# Altium footprint library Integrated_Circuit.PcbLib: 85 footprints (part 3 of 6)
Each footprint in its own frame and in the unit in brackets; x right, y up, seen from the top. Pads: shape width x height; smd on the part's side, far side on the other; paste and mask are expansions set on the pad; w line width, h text height; cw(c..) or ccw(c..) is an arc to the next point about the centre after c.
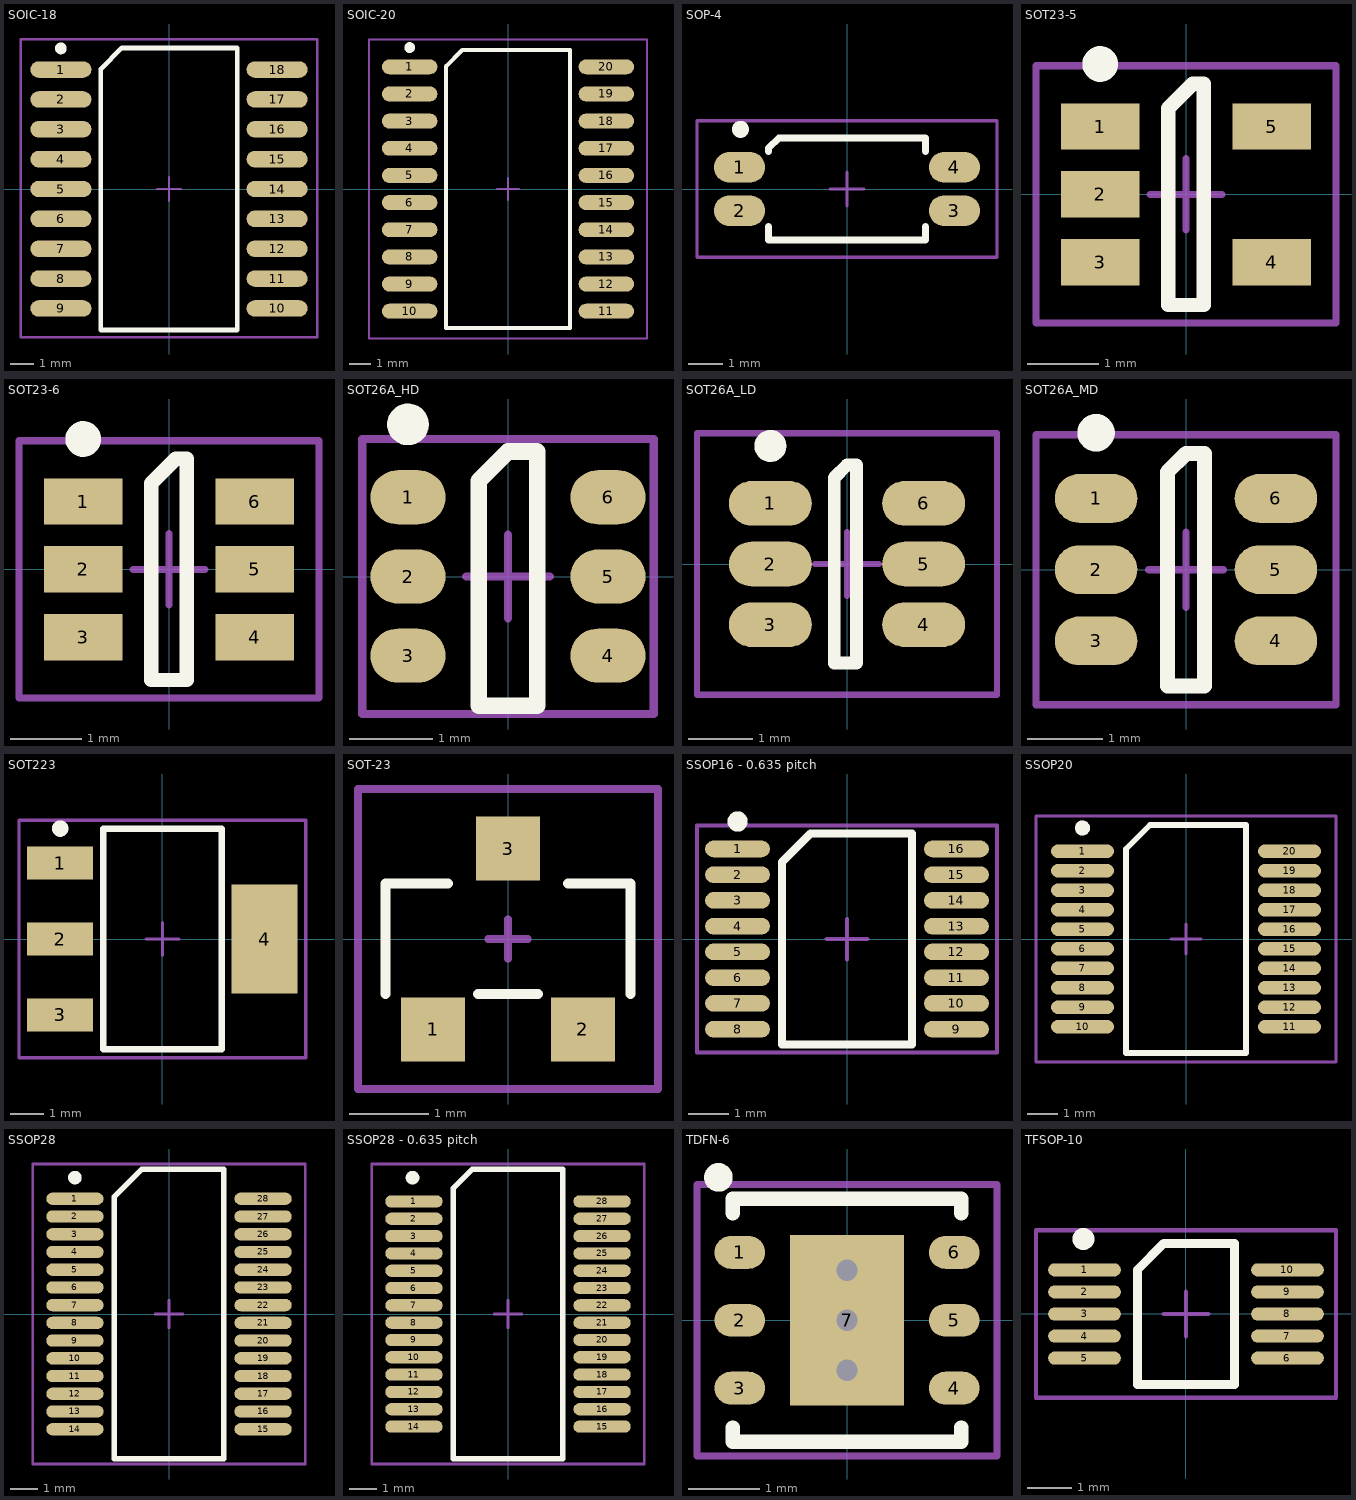
[diagram p2: the footprints below, top view; thin cyan lines are the x and y axes]

## SOIC-18 [mm]
pads (18):
  oval 2.6x0.7 smd: 1(-4.6,5.08) 2(-4.6,3.81) 3(-4.6,2.54) 4(-4.6,1.27) 5(-4.6,0) 6(-4.6,-1.27) 7(-4.6,-2.54) 8(-4.6,-3.81) 9(-4.6,-5.08) 10(4.6,-5.08) 11(4.6,-3.81) 12(4.6,-2.54) 13(4.6,-1.27) 14(4.6,0) 15(4.6,1.27) 16(4.6,2.54) 17(4.6,3.81) 18(4.6,5.08)
Top Overlay:
  circle w0.25: c-4.6,5.98 r0.125
  lines w0.2: -2.9,-6 -2.9,5.101 -2.001,6 2.9,6 2.9,-6 -2.9,-6
Mechanical 15:
  lines w0.1: -0.5,0 0.5,0 ; 0,-0.5 0,0.5 ; -6.3,-6.3 -6.3,6.365 6.3,6.365 6.3,-6.3 -6.3,-6.3
3D body "User Library-SOIC-18-300.STEP": height 2.57, standoff -0.03, extent -5.3,-5.875 5.3,5.875

## SOIC-20 [mm]
pads (20):
  oval 2.6x0.7 smd: 1(-4.6,5.715) 2(-4.6,4.445) 3(-4.6,3.175) 4(-4.6,1.905) 5(-4.6,0.635) 6(-4.6,-0.635) 7(-4.6,-1.905) 8(-4.6,-3.175) 9(-4.6,-4.445) 10(-4.6,-5.715) 11(4.6,-5.715) 12(4.6,-4.445) 13(4.6,-3.175) 14(4.6,-1.905) 15(4.6,-0.635) 16(4.6,0.635) 17(4.6,1.905) 18(4.6,3.175) 19(4.6,4.445) 20(4.6,5.715)
Top Overlay:
  circle w0.25: c-4.6,6.615 r0.125
  lines w0.2: -2.9,-6.5 -2.9,5.736 -2.136,6.5 2.9,6.5 2.9,-6.5 -2.9,-6.5
Mechanical 15:
  lines w0.1: -0.5,0 0.5,0 ; 0,-0.5 0,0.5 ; -6.5,-7 -6.5,7 6.5,7 6.5,-7 -6.5,-7
3D body "SOIC-20.STEP": height 2.57, standoff -0.03, extent -5.3,-6.5 5.3,6.5

## SOP-4 [mm] "SOP, 4 Pin, 1.27mm Pitch"
pads (4):
  oval 1.5x0.9 smd: 1(-3.15,0.635) 2(-3.15,-0.635) 3(3.15,-0.635) 4(3.15,0.635)
Top Overlay:
  circle w0.25: c-3.125,1.75 r0.125
  lines w0.2: -2.3,-1.1 -2.3,-1.5 2.3,-1.5 2.3,-1.1 ; -2.3,1.1 -2.3,1.2 -2,1.5 2.3,1.5 2.3,1.1
Mechanical 15:
  lines w0.1: -0.5,0 0.5,0 ; 0,-0.5 0,0.5 ; -4.4,-2 4.4,-2 4.4,2 -4.4,2 -4.4,-2
3D body "SOP-4.STEP": height 2.1, standoff 0, extent -3.5,-1.4 3.5,1.4

## SOT23-5 [mm]
height 1.45
pads (5):
  rect 1.1x0.65 smd: 1(-1.2,0.95) 2(-1.2,0) 3(-1.2,-0.95) 4(1.2,-0.95) 5(1.2,0.95)
Top Overlay:
  circle w0.25: c-1.2,1.825 r0.125
  lines w0.2: -0.25,-1.55 0.25,-1.55 0.25,1.55 0.094,1.55 -0.25,1.206 -0.25,-1.55
Mechanical 15:
  lines w0.1: -0.5,0 0.5,0 ; 0,-0.5 0,0.5 ; -2.1,-1.8 -2.1,1.8 2.1,1.8 2.1,-1.8 -2.1,-1.8
3D body "SOT23-5.STEP": height 1.3, standoff 0, extent -1.5,-1.5 1.5,1.5

## SOT23-6 [mm]
height 1.45
pads (6):
  rect 1.1x0.65 smd: 1(-1.2,0.95) 2(-1.2,0) 3(-1.2,-0.95) 4(1.2,-0.95) 5(1.2,0) 6(1.2,0.95)
Top Overlay:
  circle w0.25: c-1.2,1.825 r0.125
  lines w0.2: -0.25,-1.55 -0.25,1.206 0.094,1.55 0.25,1.55 0.25,-1.55 -0.25,-1.55
Mechanical 15:
  lines w0.1: -0.5,0 0.5,0 ; 0,-0.5 0,0.5 ; -2.1,-1.8 2.1,-1.8 2.1,1.8 -2.1,1.8 -2.1,-1.8
3D body "User Library-SOT23-6-2.STEP": height 1.45, standoff 0, extent -1.4,-1.45 1.4,1.45

## SOT26A_HD [mm] "SOT23, 6-Leads, Body 2.9x1.7mm, Pitch 0.95mm, Lead Span 2.8mm, IPC High Density"
height 1.45
pads (6):
  oval 0.9x0.65 smd: 1(-1.2,0.95) 2(-1.2,0) 3(-1.2,-0.95) 4(1.2,-0.95) 5(1.2,0) 6(1.2,0.95)
Top Overlay:
  circle w0.25: c-1.2,1.825 r0.125
  lines w0.2: -0.35,1 -0.35,1.15 ; -0.35,1.15 -0.35,-1.55 0.35,-1.55 0.35,1.5 0,1.5 -0.35,1.15
Mechanical 15:
  lines w0.1: -0.5,0 0.5,0 ; 0,-0.5 0,0.5 ; -1.75,-1.65 -1.75,1.65 1.75,1.65 1.75,-1.65 -1.75,-1.65
3D body "User Library-SOT23-6-1.step": height 1.09, standoff 0, extent -1.207,-1.41 1.219,1.384

## SOT26A_LD [mm]
pads (6):
  oval 1.3x0.7 smd: 1(-1.2,0.95) 2(-1.2,0) 3(-1.2,-0.95) 4(1.2,-0.95) 5(1.2,0) 6(1.2,0.95)
Top Overlay:
  circle w0.25: c-1.2,1.85 r0.125
  lines w0.2: -0.2,1.3 -0.2,1.35 ; -0.2,1.35 0,1.55 0.15,1.55 0.15,-1.55 -0.2,-1.55 -0.2,1.35
Mechanical 15:
  lines w0.1: -0.5,0 0.5,0 ; 0,-0.5 0,0.5 ; -2.35,-2.05 -2.35,2.05 2.35,2.05 2.35,-2.05 -2.35,-2.05
3D body "User Library-SOT23-6-1.step": height 1.09, standoff 0, extent -1.232,-1.384 1.194,1.41

## SOT26A_MD [mm] "SOT23, 6-Leads, Body 2.9x1.7mm, Pitch 0.95mm, Lead Span 2.8mm, IPC Medium Density"
height 1.45
pads (6):
  oval 1.1x0.65 smd: 1(-1.2,0.95) 2(-1.2,0) 3(-1.2,-0.95) 4(1.2,-0.95) 5(1.2,0) 6(1.2,0.95)
Top Overlay:
  circle w0.25: c-1.2,1.825 r0.125
  lines w0.2: -0.25,1.2 -0.25,1.3 ; -0.25,1.3 -0.25,-1.55 0.25,-1.55 0.25,1.55 0,1.55 -0.25,1.3
Mechanical 15:
  lines w0.1: -0.5,0 0.5,0 ; 0,-0.5 0,0.5 ; -2,-1.8 2,-1.8 2,1.8 -2,1.8 -2,-1.8
3D body "User Library-SOT23-6-1.step": height 1.09, standoff 0, extent -1.213,-1.397 1.213,1.397

## SOT223 [mm] "SOT223, 4-Leads, Body 6.5x3.5mm, Pitch 2.3mm, Lead Span 7mm, IPC Medium Density"
height 1.8
pads (4):
  rect 2x1 smd: 1(-3.1,2.3) 2(-3.1,0) 3(-3.1,-2.3)
  rect 2x3.3 smd: 4(3.1,0)
Top Overlay:
  circle w0.25: c-3.1,3.35 r0.125
  lines w0.2: -1.8,-3.35 1.8,-3.35 1.8,3.35 -1.8,3.35 -1.8,-3.35
Mechanical 13:
  lines w0.1: -1.85,-3.35 1.85,-3.35 1.85,3.35 -1.85,3.35 -1.85,-3.35
Mechanical 15:
  lines w0.1: -0.5,0 0.5,0 ; 0,-0.5 0,0.5 ; -4.35,-3.6 4.35,-3.6 4.35,3.6 -4.35,3.6 -4.35,-3.6
3D body "SOT-223.STEP": height 1.85, standoff -0.05, extent -3.674,-3.398 3.53,3.302

## SOT-23 [mil]
pads (3):
  rect 32x32 smd: 1(-37.4,-45.1) 2(37.4,-45.1) 3(0,45.1)
Top Overlay:
  lines w5: -61,-27.5 -61,27.6 -30,27.6 ; -15,-27.5 15,-27.5 ; 30,27.6 61,27.6 61,-27.5
Mechanical 15:
  lines w3.94: -9.84,0 9.84,0 ; 0,-9.84 0,9.84 ; -74.8,-74.8 -74.8,74.8 74.8,74.8 74.8,-74.8 -74.8,-74.8
3D body "SW3DPS-SOT-23-DEFAULT.step": height 42.91, standoff -0.39, extent -59.06,-49.21 59.06,49.21

## SSOP16 - 0.635 pitch [mm]
pads (16):
  oval 1.6x0.41 smd: 1(-2.7,2.222) 2(-2.7,1.587) 3(-2.7,0.953) 4(-2.7,0.318) 5(-2.7,-0.318) 6(-2.7,-0.953) 7(-2.7,-1.587) 8(-2.7,-2.222) 9(2.7,-2.222) 10(2.7,-1.587) 11(2.7,-0.953) 12(2.7,-0.318) 13(2.7,0.318) 14(2.7,0.953) 15(2.7,1.587) 16(2.7,2.222)
Top Overlay:
  circle w0.25: c-2.7,2.9 r0.125
  lines w0.2: -1.6,-2.6 1.6,-2.6 1.6,2.6 -0.9,2.6 -1.6,1.9 -1.6,-2.6
Mechanical 15:
  lines w0.1: -0.5,0 0.5,0 ; 0,-0.5 0,0.5 ; -3.7,-2.8 -3.7,2.8 3.7,2.8 3.7,-2.8 -3.7,-2.8
3D body "User Library-SSOP16.step": height 1.1, standoff 0, extent -2.997,-2.525 2.997,2.453

## SSOP20 [mm]
pads (20):
  oval 2.1x0.45 smd: 1(-3.45,2.925) 2(-3.45,2.275) 3(-3.45,1.625) 4(-3.45,0.975) 5(-3.45,0.325) 6(-3.45,-0.325) 7(-3.45,-0.975) 8(-3.45,-1.625) 9(-3.45,-2.275) 10(-3.45,-2.925) 11(3.45,-2.925) 12(3.45,-2.275) 13(3.45,-1.625) 14(3.45,-0.975) 15(3.45,-0.325) 16(3.45,0.325) 17(3.45,0.975) 18(3.45,1.625) 19(3.45,2.275) 20(3.45,2.925)
Top Overlay:
  circle w0.25: c-3.45,3.7 r0.125
  lines w0.2: -2,-3.8 2,-3.8 2,3.8 -1.2,3.8 -2,3 -2,-3.8
Mechanical 15:
  lines w0.1: -0.5,0 0.5,0 ; 0,-0.5 0,0.5 ; -5,-4.1 -5,4.1 5,4.1 5,-4.1 -5,-4.1
3D body "User Library-SSOP 20 PIN-1.STEP": height 1.98, standoff -0.01, extent -3.95,-3.665 3.95,3.665

## SSOP28 [mm]
pads (28):
  oval 2.1x0.45 smd: 1(-3.45,4.225) 2(-3.45,3.575) 3(-3.45,2.925) 4(-3.45,2.275) 5(-3.45,1.625) 6(-3.45,0.975) 7(-3.45,0.325) 8(-3.45,-0.325) 9(-3.45,-0.975) 10(-3.45,-1.625) 11(-3.45,-2.275) 12(-3.45,-2.925) 13(-3.45,-3.575) 14(-3.45,-4.225) 15(3.45,-4.225) 16(3.45,-3.575) 17(3.45,-2.925) 18(3.45,-2.275) 19(3.45,-1.625) 20(3.45,-0.975) 21(3.45,-0.325) 22(3.45,0.325) 23(3.45,0.975) 24(3.45,1.625) 25(3.45,2.275) 26(3.45,2.925) 27(3.45,3.575) 28(3.45,4.225)
Top Overlay:
  circle w0.25: c-3.45,5 r0.125
  lines w0.2: -2,-5.3 2,-5.3 2,5.3 -1,5.3 -2,4.3 -2,-5.3
Mechanical 15:
  lines w0.1: -0.5,0 0.5,0 ; 0,-0.5 0,0.5 ; -5,-5.5 -5,5.5 5,5.5 5,-5.5 -5,-5.5
3D body "User Library-SSOP-28-1.STEP": height 2.15, standoff 0, extent -3.878,-5.165 3.878,5.165

## SSOP28 - 0.635 pitch [mm]
pads (28):
  oval 2.1x0.45 smd: 1(-3.45,4.127) 2(-3.45,3.492) 3(-3.45,2.857) 4(-3.45,2.222) 5(-3.45,1.587) 6(-3.45,0.953) 7(-3.45,0.318) 8(-3.45,-0.318) 9(-3.45,-0.953) 10(-3.45,-1.587) 11(-3.45,-2.222) 12(-3.45,-2.857) 13(-3.45,-3.492) 14(-3.45,-4.127) 15(3.45,-4.127) 16(3.45,-3.492) 17(3.45,-2.857) 18(3.45,-2.222) 19(3.45,-1.587) 20(3.45,-0.953) 21(3.45,-0.318) 22(3.45,0.318) 23(3.45,0.953) 24(3.45,1.587) 25(3.45,2.222) 26(3.45,2.857) 27(3.45,3.492) 28(3.45,4.127)
Top Overlay:
  circle w0.25: c-3.5,5 r0.125
  lines w0.2: -2,-5.3 -2,4.617 -1.317,5.3 2,5.3 2,-5.3 -2,-5.3
Mechanical 15:
  lines w0.1: -0.5,0 0.5,0 ; 0,-0.5 0,0.5 ; -5,-5.5 5,-5.5 5,5.5 -5,5.5 -5,-5.5
3D body "User Library-SSOP-28-1.STEP": height 2.15, standoff 0, extent -3.878,-5.165 3.878,5.165
3D body "User Library-SSOP-28-1.step": height 2.15, standoff 0, extent -3.878,-5.165 3.878,5.165

## TDFN-6 [mm]
pads (7):
  oval 0.71x0.46 smd: 1(-1.5,0.95) 2(-1.5,0) 3(-1.5,-0.95) 4(1.5,-0.95) 5(1.5,0) 6(1.5,0.95)
  rect 1.6x2.39 smd: 7(0,0)
via 0,-0.7 diameter 0.5 hole 0.3
via 0,0.7 diameter 0.5 hole 0.3
via 0,0 diameter 0.5 hole 0.3
Top Overlay:
  circle w0.25: c-1.8,2 r0.075
  lines w0.2: -1.6,-1.5 -1.6,-1.7 1.6,-1.7 1.6,-1.5 ; -1.6,1.5 -1.6,1.7 1.6,1.7 1.6,1.5
Mechanical 15:
  lines w0.1: -0.5,0 0.5,0 ; 0,-0.5 0,0.5 ; -2.1,-1.9 2.1,-1.9 2.1,1.9 -2.1,1.9 -2.1,-1.9
3D body "TDFN-6.STEP": height 0.75, standoff -0.03, extent -1.52,-1.5 1.52,1.5

## TFSOP-10 [mm] "without exposed pad"
height 1
pads (10):
  oval 1.65x0.3 smd: 1(-2.3,1) 2(-2.3,0.5) 3(-2.3,0) 4(-2.3,-0.5) 5(-2.3,-1) 6(2.3,-1) 7(2.3,-0.5) 8(2.3,0) 9(2.3,0.5) 10(2.3,1)
Top Overlay:
  circle w0.25: c-2.325,1.7 r0.125
  lines w0.2: -1.1,-1.6 -1.1,1 -0.5,1.6 1.1,1.6 1.1,-1.6 -1.1,-1.6
Mechanical 15:
  lines w0.1: -0.5,0 0.5,0 ; 0,-0.5 0,0.5 ; -3.4,-1.9 -3.4,1.9 3.4,1.9 3.4,-1.9 -3.4,-1.9
3D body "msop-10.STEP": height 1.15, standoff 0, extent -2.45,-1.5 2.45,1.5